# Altium footprint library hphonglib.PcbLib: 1250 footprints (part 15 of 79)
Each footprint in its own frame and in the unit in brackets; x right, y up, seen from the top. Pads: shape width x height; smd on the part's side, far side on the other; paste and mask are expansions set on the pad; w line width, h text height; cw(c..) or ccw(c..) is an arc to the next point about the centre after c.
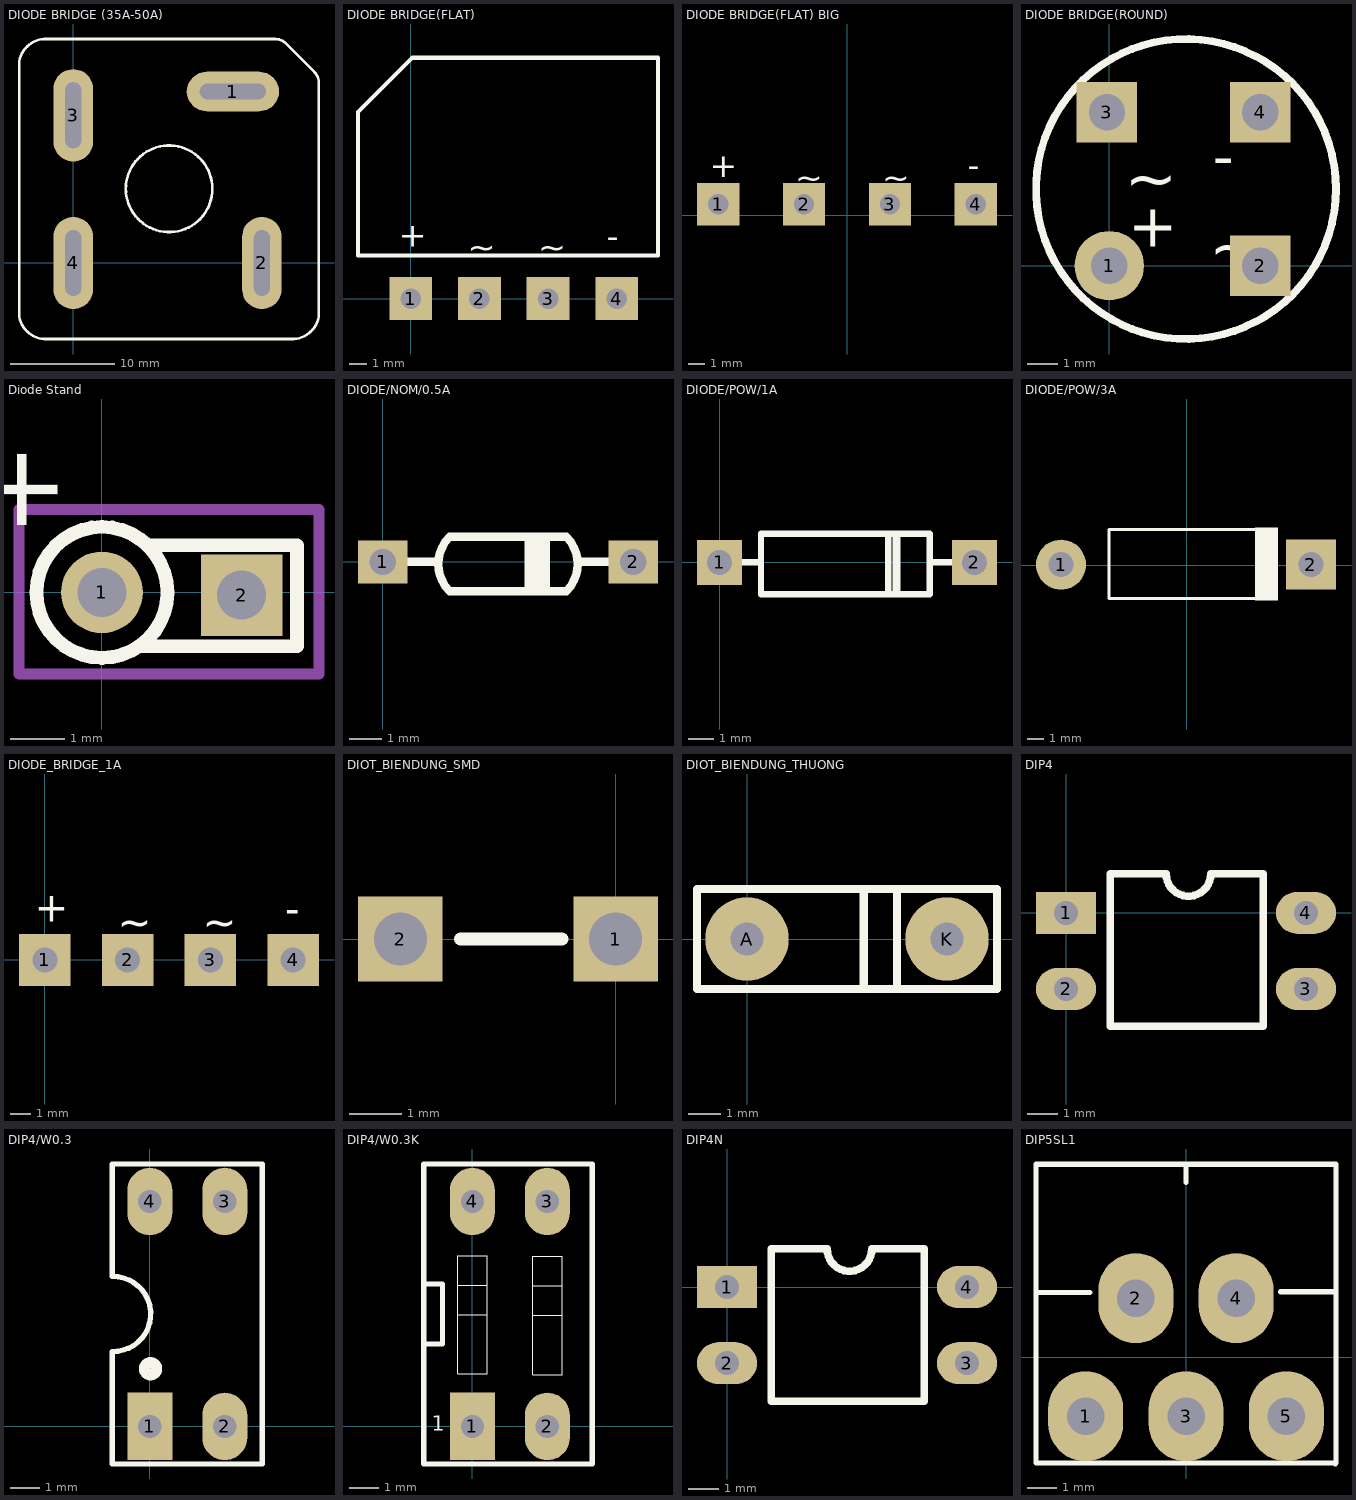
[diagram p14: the footprints below, top view; thin cyan lines are the x and y axes]

## DIODE BRIDGE (35A-50A) [mil] "Diode Bridge 35A-50A; Solder Pad 35mil"
pads (4):
  oval 350x150 / inner round 62 / far side oval 350x150 hole 60 slot 250 at 0 deg: 1(605,650)
  oval 150x350 / inner round 62 / far side oval 150x350 hole 60 slot 250 at 90 deg: 2(715,0) 3(0,560) 4(0,0)
Top Overlay:
  circle w10: c363.15,281.32 r164.16
  lines w10: -205.42,-190 -205.42,753 ; -205.42,-181.63 ccw(c-104.97,-187.53) -99.07,-287.98 ; -205.42,742.53 cw(c-104.97,748.43) -99.07,848.88 ; -105,-287.98 824.73,-287.98 ccw(c830.63,-187.53) 931.08,-181.63 ; -105,848.88 765,848.88 ; 766,849 cw(c766,792.59) 805.89,832.48 ; 805,833 914,724 ; 914.37,723.79 cw(c874.48,683.9) 930.89,683.9 ; 931,679 931,680 ; 931.08,-185 931.08,686
3D body "User Library-Bridge KBPC 5012 F.STEP": height 295.28, standoff -570.87, extent -200,-282.99 925.98,842.99

## DIODE BRIDGE(FLAT) [mm]
pads (4):
  rect 2.5x2.5 / inner round 1.575 / far side rect 2.5x2.5 hole 1.2: 1(0,0) 2(4,0) 3(8,0) 4(12,0)
Top Overlay:
  lines w0.254: -3.073,2.515 -3.073,10.871 0.076,14.021 14.402,14.021 14.402,2.515 2.045,2.515 -3.073,2.515
  text "-" at 11.405,2.946 h1.43
  text "+" at -0.686,3.01 h1.43
  text "~" at 7.417,2.299 h1.43
  text "~" at 3.327,2.286 h1.43

## DIODE BRIDGE(FLAT) BIG [mm]
pads (4):
  rect 2.5x2.5 hole 1.2: 1(-7.62,0.66) 2(-2.54,0.66) 3(2.54,0.66) 4(7.62,0.66)
Top Overlay:
  text "~" at -3.073,1.549 h1.43
  text "~" at 2.083,1.549 h1.43
  text "+" at -8.103,2.261 h1.43
  text "-" at 7.137,2.286 h1.43
3D body "User Library-bridge 2.step": height 24.27, standoff -12.36, extent -11.15,-1.78 11.15,1.98

## DIODE BRIDGE(ROUND) [mm]
height 5.59
pads (4):
  round 2.3 hole 1.2: 1(0,0)
  rect 2x2 hole 1.2: 2(5,0) 3(-0.08,5.08) 4(5,5.08)
Top Overlay:
  circle w0.254: c2.54,2.54 r4.968
  text "+" at 0.635,0.635 h1.43
  text "-" at 3.429,2.921 h1.43
  text "~" at 0.508,2.159 h1.52
  text "~" at 3.302,-0.127 h1.52

## Diode Stand [mm] "500mW , Axial; Body 3.8 x 1.9 mm (LxDia. max), Lead Dia. 0.53 mm (max)"
height 1.9
pads (2):
  round 1.5 hole 0.9: 1(0,0)
  rect 1.5x1.5 hole 0.9: 2(2.565,-0.051)
Top Overlay:
  circle w0.254: c0,0 r1.203
  lines w0.254: 0.711,-0.991 3.581,-0.991 3.581,0.864 0.838,0.864
  text "+" at -0.813,1.016 h1.52
Bottom Overlay:
  lines w0.254: -1.499,-1.499 3.988,-1.499 3.988,1.473 -1.499,1.473 -1.499,-1.499
Mechanical 13:
  lines w0.2: -1.524,-1.499 3.988,-1.499 3.988,1.524 -1.524,1.524 -1.524,-1.499
3D body "1N4007_Stand.STEP": height 8.39, standoff 0, extent -1.321,-1.372 2.946,1.295

## DIODE/NOM/0.5A [mm]
pads (2):
  rect 1.5x1.3 hole 0.8: 1(0,0) 2(7.62,0)
Top Overlay:
  lines w0.254: 0.635,0 1.651,0 ; 4.445,-0.762 4.445,0.762 ; 4.699,-0.889 4.699,0.762 ; 4.953,-0.889 4.953,0.762 ; 5.969,0 7.112,0 ; 2.032,-0.889 cw(c2.857,-0.064) 2.032,0.762 5.588,0.762 cw(c4.763,-0.064) 5.588,-0.889 2.032,-0.889

## DIODE/POW/1A [mm]
pads (2):
  rect 1.8x1.8 hole 1: 1(0,0) 2(10.16,0)
Top Overlay:
  lines w0.2: 6.985,-1.27 6.985,1.143 ; 7.112,-1.27 7.112,1.143
  lines w0.254: 0.635,0 1.651,0 ; 6.731,-1.27 6.731,1.143 ; 8.382,0 9.525,0 ; 1.651,-1.27 8.382,-1.27 8.382,1.143 1.651,1.143 1.651,-1.27
3D body "SW3DPS-DIODE0_4.step": height 2.55, standoff -2.54, extent -0.381,-1.283 10.541,1.283

## DIODE/POW/3A [mil]
pads (2):
  round 120 hole 60: 1(-301,1)
  rect 120x120 hole 60: 2(298,1)
Top Overlay:
  rectangle: 164,-85 219,90
  lines w7.87: 214,-65 199,-80 -186,-80 -186,85 194,85 214,65
3D body "User Library-BYW98.step": height 248.03, standoff -92.52, extent -320.86,-104.33 320.87,104.33

## DIODE_BRIDGE_1A [mm]
pads (4):
  rect 2.5x2.5 / inner round 1.575 / far side rect 2.5x2.5 hole 1.2: 1(0,0) 2(4,0) 3(8,0) 4(12,0)
Top Overlay:
  text "~" at 3.531,1.118 h1.43
  text "~" at 7.62,1.13 h1.43
  text "+" at -0.483,1.841 h1.43
  text "-" at 11.608,1.778 h1.43
3D body "User Library-DiodeBridge.step": height 10.7, standoff -13.5, extent -1.27,-2.515 13.309,2.495

## DIOT_BIENDUNG_SMD [mm]
pads (2):
  rect 1.6x1.6 hole 1: 1(0,0) 2(-4.064,0)
Top Overlay:
  lines w0.254: -2.928,0 -1.016,0

## DIOT_BIENDUNG_THUONG [mm]
pads (2):
  round 2.54 hole 1: A(0,0) K(6.096,0)
Top Overlay:
  lines w0.254: 3.556,-1.524 3.556,1.524 ; 4.572,-1.524 4.572,1.524 ; -1.524,-1.524 7.62,-1.524 7.62,1.524 -1.524,1.524 -1.524,-1.524

## DIP4 [mm]
pads (4):
  rect 2x1.4 hole 0.8: 1(0,0)
  oval 2x1.4 hole 0.8: 2(0,-2.54) 3(8,-2.54) 4(8,0)
Top Overlay:
  lines w0.254: 3.258,1.295 1.48,1.295 1.48,-3.785 6.57,-3.785 6.57,1.295 4.825,1.295 cw(c4.082,1.295) 3.34,1.295
3D body: height 3, standoff 0.5, extent -0.17,-3.281 0.18,-1.782
3D body: height 0.5, standoff -3.8, extent -0.17,-2.807 0.18,-2.257
3D body: height 3, standoff 2.65, extent 0.005,-0.741 1.705,0.758
3D body: height 3, standoff 0.5, extent -0.17,-0.741 0.18,0.758
3D body: height 0.5, standoff -3.8, extent -0.17,-0.267 0.18,0.283
3D body: height 3, standoff 2.65, extent 0.005,-3.282 1.705,-1.782
3D body: height 5.3, standoff 0.3, extent 1.48,-3.725 6.58,1.295
3D body: height 3, standoff 2.65, extent 6.31,-0.757 8.01,0.743
3D body: height 3, standoff 0.5, extent 7.835,-0.757 8.185,0.743
3D body: height 0.5, standoff -3.8, extent 7.835,-0.282 8.185,0.268
3D body: height 3, standoff 0.5, extent 7.835,-3.297 8.185,-1.797
3D body: height 0.5, standoff -3.8, extent 7.835,-2.822 8.185,-2.272
3D body: height 3, standoff 2.65, extent 6.31,-3.297 8.01,-1.797
3D body: height 5.4, standoff 4, extent 3.094,0.341 5.094,1.341

## DIP4/W0.3 [mil] "4 PIN, W 300mil, Pin to pin 100mil"
height 100
pads (4):
  rect 60x90 hole 31: 1(0,0)
  oval 60x90 hole 31: 2(100,0) 3(100,300) 4(0,300)
Top Overlay:
  circle w15: c1,77 r8
  lines w7: -50.38,100.05 ccw(c-48.69,150.02) -50,200 ; -50,100 -50,-50 150,-50 150,350 -50,350 -50,201
3D body "SW3DPS-DIP4-DEFAULT.STEP": height 169.69, standoff -129.13, extent -59.06,-10 159.06,304.96

## DIP4/W0.3K [mil] "4 PIN, W 400mil , L 450mil,Pin to pin 100mil"
height 100
pads (4):
  rect 60x90 hole 31: 1(0,0)
  oval 60x90 hole 31: 2(100,0) 3(100,300) 4(0,300)
Top Overlay:
  lines w1.5: -19.68,149 19.68,149 ; -19.68,188.37 19.68,188.37 ; 80.31,148 119.69,148 ; 80.31,187.37 119.69,187.37 ; -19.68,70.26 19.68,70.26 19.68,227.74 -19.68,227.74 -19.68,70.26 ; 80.31,69.26 119.69,69.26 119.69,226.74 80.31,226.74 80.31,69.26
  lines w7: -65,110 -40,110 -40,190 -65,190 ; -65,-50 160,-50 160,350 -65,350 -65,-50
  text "1" at -54,-6 h20
3D body "User Library-Switch-Piano-DIP-2.STEP": height 354.33, standoff -157.48, extent -66.22,-103.43 170,343.43

## DIP4N [mm]
pads (4):
  rect 2x1.4 hole 0.8: 1(0,0)
  oval 2x1.4 hole 0.8: 2(0,-2.54) 3(8,-2.54) 4(8,0)
Top Overlay:
  lines w0.254: 3.258,1.27 1.48,1.27 1.48,-3.81 6.57,-3.81 6.57,1.27 4.825,1.27 cw(c4.082,1.27) 3.34,1.27
3D body "DIP4.STEP": height 4.81, standoff -2.78, extent -0.025,-4.015 7.975,1.525

## DIP5SL1 [mm]
pads (5):
  oval 2.54x3.048 hole 1.27: 1(-3.4,-2) 2(-1.7,2) 3(0,-2) 4(1.7,2) 5(3.4,-2)
Top Overlay:
  lines w0.178: -5.076,2.191 -3.248,2.191 ; 0,5.918 0,6.502 ; 3.204,2.216 5.033,2.216 ; -5.08,-3.581 5.029,-3.581 5.055,-3.607 5.08,-3.581 5.08,6.534 -5.08,6.534 -5.08,-3.581
3D body "TO220-5.STEP": height 18.81, standoff -9.47, extent -4.993,-2.246 5.207,6.31